# Altium footprint library SILICA_PCBLIB.PcbLib: 161 footprints (part 4 of 11)
Each footprint in its own frame and in the unit in brackets; x right, y up, seen from the top. Pads: shape width x height; smd on the part's side, far side on the other; paste and mask are expansions set on the pad; w line width, h text height; cw(c..) or ccw(c..) is an arc to the next point about the centre after c.
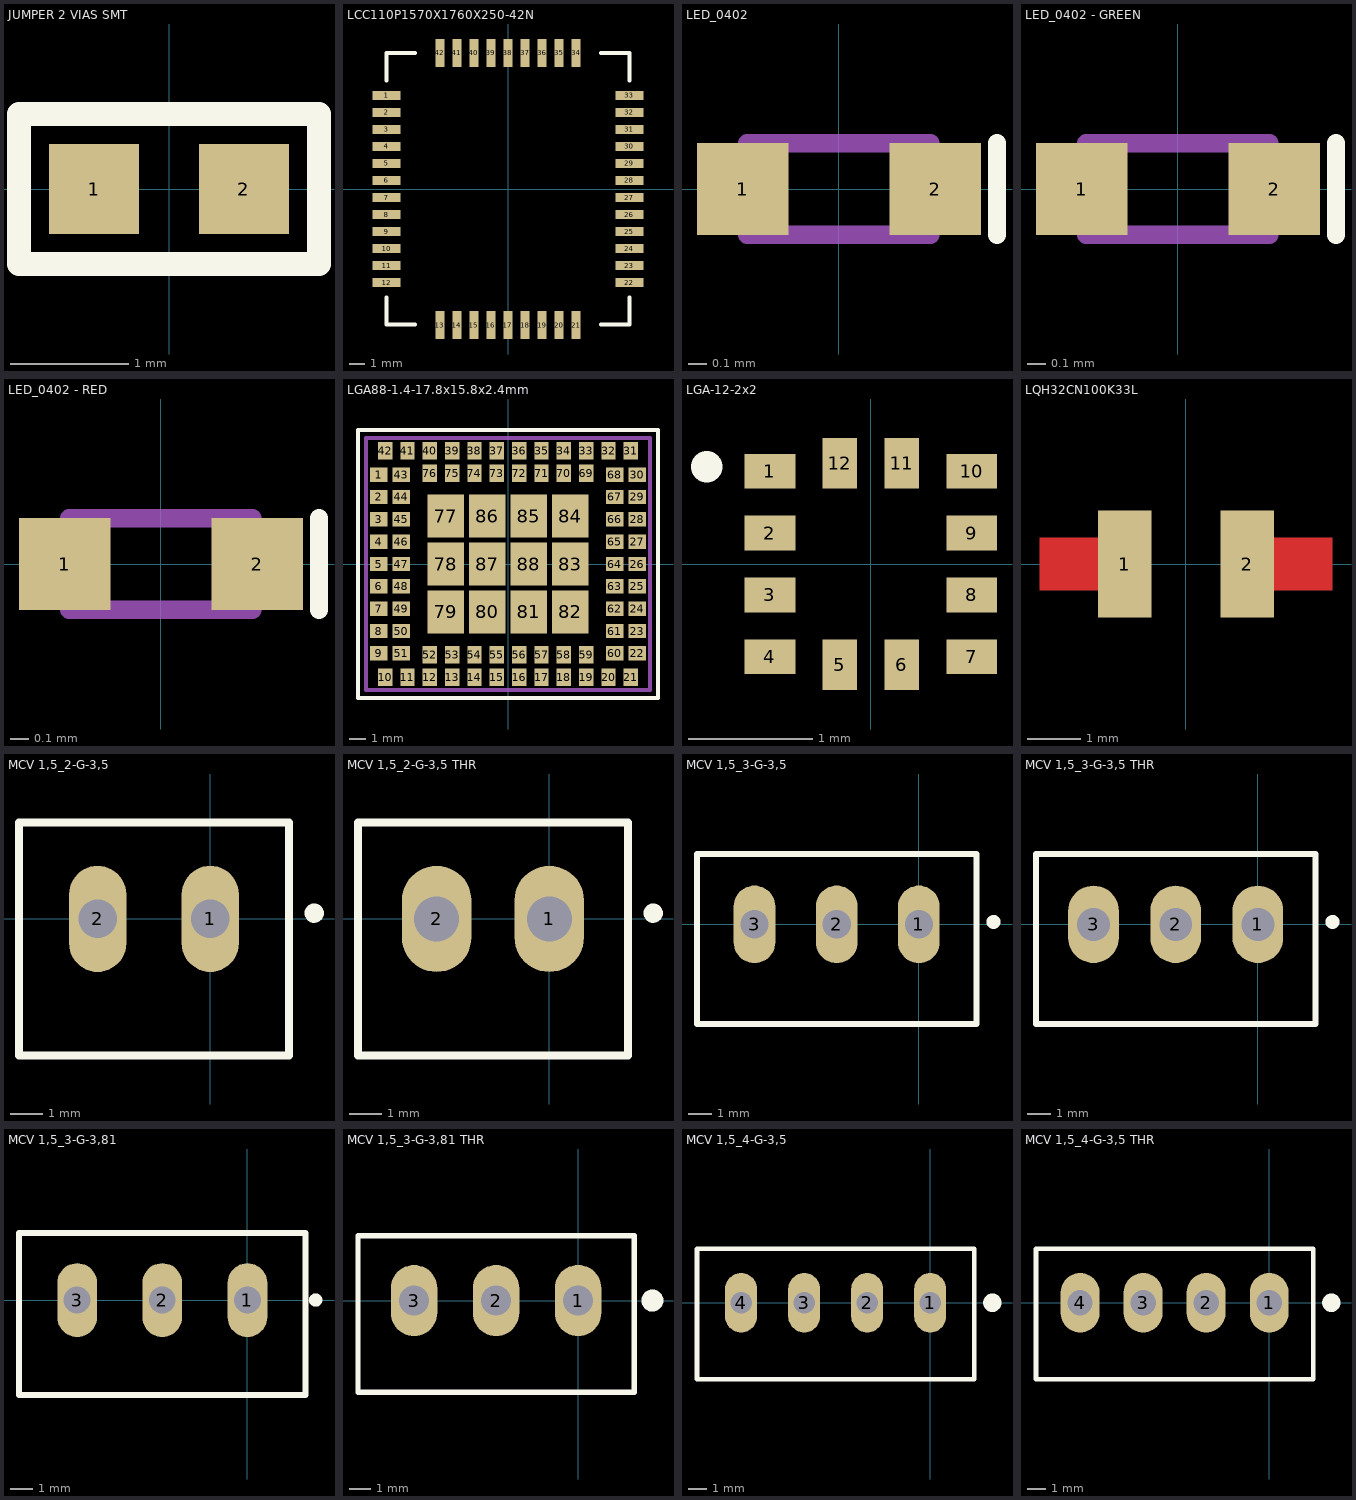
[diagram p3: the footprints below, top view; thin cyan lines are the x and y axes]

## JUMPER 2 VIAS SMT [mil]
height 51.18
pads (2):
  rect 30x30 smd: 1(-25,0) 2(25,0)
Top Overlay:
  lines w7.87: -50,-25 -50,25 50,25 50,-25 -50,-25

## LCC110P1570X1760X250-42N [mm] "SIM800C"
height 2.5
pads (42):
  rect 1.8x0.6 smd: 1(-7.85,6.05) 2(-7.85,4.95) 3(-7.85,3.85) 4(-7.85,2.75) 5(-7.85,1.65) 6(-7.85,0.55) 7(-7.85,-0.55) 8(-7.85,-1.65) 9(-7.85,-2.75) 10(-7.85,-3.85) 11(-7.85,-4.95) 12(-7.85,-6.05) 22(7.85,-6.05) 23(7.85,-4.95) 24(7.85,-3.85) 25(7.85,-2.75) 26(7.85,-1.65) 27(7.85,-0.55) 28(7.85,0.55) 29(7.85,1.65) 30(7.85,2.75) 31(7.85,3.85) 32(7.85,4.95) 33(7.85,6.05)
  rect 0.6x1.8 smd: 13(-4.4,-8.8) 14(-3.3,-8.8) 15(-2.2,-8.8) 16(-1.1,-8.8) 17(0,-8.8) 18(1.1,-8.8) 19(2.2,-8.8) 20(3.3,-8.8) 21(4.4,-8.8) 34(4.4,8.8) 35(3.3,8.8) 36(2.2,8.8) 37(1.1,8.8) 38(0,8.8) 39(-1.1,8.8) 40(-2.2,8.8) 41(-3.3,8.8) 42(-4.4,8.8)
Top Overlay:
  lines w0.254: -7.862,-7 -7.862,-8.762 -6,-8.762 ; -7.862,7 -7.862,8.8 -6,8.8 ; 6,-8.762 7.85,-8.762 7.85,-7 ; 6,8.8 7.85,8.8 7.85,7
Multi-Layer:
  pour cut-out: 5.75,7.438 5.75,2.475 6.8,2.475 6.8,7.438
3D body "User Library-SIM800C.STEP": height 2.3, standoff -0.01, extent -7.85,-8.8 7.85,8.8

## LED_0402 [mm]
height 0.5
pads (2):
  rect 0.5x0.5 smd paste-0.051 mask+0: 1(-0.525,0) 2(0.525,0)
Top Overlay:
  lines w0.1: 0.863,-0.25 0.863,0.25
Mechanical 13:
  lines w0.1: -0.5,-0.25 -0.5,0.25 0.5,0.25 0.5,-0.25 -0.5,-0.25
3D body "User Library-CAPC1005X06.STEP": height 0.6, standoff 0, extent -0.5,-0.25 0.5,0.25

## LED_0402 - GREEN [mm]
height 0.5
pads (2):
  rect 0.5x0.5 smd paste-0.051 mask+0: 1(-0.525,0) 2(0.525,0)
Top Overlay:
  lines w0.1: 0.863,-0.25 0.863,0.25
Mechanical 13:
  lines w0.1: -0.5,-0.25 0.5,-0.25 0.5,0.25 -0.5,0.25 -0.5,-0.25
3D body "User Library-led_0402LED0402 green.STEP": height 0.45, standoff 0, extent -0.505,-0.25 0.505,0.25

## LED_0402 - RED [mm]
height 0.5
pads (2):
  rect 0.5x0.5 smd paste-0.051 mask+0: 1(-0.525,0) 2(0.525,0)
Top Overlay:
  lines w0.1: 0.863,-0.25 0.863,0.25
Mechanical 13:
  lines w0.1: -0.5,-0.25 0.5,-0.25 0.5,0.25 -0.5,0.25 -0.5,-0.25
3D body "User Library-LED_1006_R.STEP": height 0.2, standoff 0, extent -0.5,-0.3 0.5,0.3

## LGA88-1.4-17.8x15.8x2.4mm [mm]
pads (88):
  rect 1.1x0.9 smd: 1(-8.1,5.6) 2(-8.1,4.2) 3(-8.1,2.8) 4(-8.1,1.4) 5(-8.1,0) 6(-8.1,-1.4) 7(-8.1,-2.8) 8(-8.1,-4.2) 9(-8.1,-5.6) 22(8.099,-5.6) 23(8.099,-4.2) 24(8.099,-2.8) 25(8.099,-1.4) 26(8.099,0) 27(8.099,1.4) 28(8.099,2.8) 29(8.099,4.2) 30(8.099,5.6) 43(-6.7,5.6) 44(-6.7,4.2) 45(-6.7,2.8) 46(-6.7,1.4) 47(-6.7,0) 48(-6.7,-1.4) 49(-6.7,-2.8) 50(-6.7,-4.2) 51(-6.7,-5.6) 60(6.699,-5.6) 61(6.699,-4.2) 62(6.699,-2.8) 63(6.699,-1.4) 64(6.699,0) 65(6.699,1.4) 66(6.699,2.8) 67(6.699,4.2) 68(6.699,5.6)
  rect 0.9x1.1 smd: 10(-7.7,-7.1) 11(-6.3,-7.1) 12(-4.9,-7.1) 13(-3.5,-7.1) 14(-2.1,-7.1) 15(-0.7,-7.1) 16(0.7,-7.1) 17(2.1,-7.1) 18(3.5,-7.1) 19(4.9,-7.1) 20(6.3,-7.1) 21(7.7,-7.1) 31(7.7,7.1) 32(6.3,7.1) 33(4.9,7.1) 34(3.5,7.1) 35(2.1,7.1) 36(0.7,7.1) 37(-0.7,7.1) 38(-2.1,7.1) 39(-3.5,7.1) 40(-4.9,7.1) 41(-6.3,7.1) 42(-7.7,7.1) 52(-4.9,-5.7) 53(-3.5,-5.7) 54(-2.1,-5.7) 55(-0.7,-5.7) 56(0.7,-5.7) 57(2.1,-5.7) 58(3.5,-5.7) 59(4.9,-5.7) 69(4.9,5.7) 70(3.5,5.7) 71(2.1,5.7) 72(0.7,5.7) 73(-0.7,5.7) 74(-2.1,5.7) 75(-3.5,5.7) 76(-4.9,5.7)
  rect 2.3x2.7 smd: 77(-3.9,3) 78(-3.9,0) 79(-3.9,-3) 80(-1.3,-3) 81(1.3,-3) 82(3.9,-3) 83(3.9,0) 84(3.9,3) 85(1.3,3) 86(-1.3,3) 87(-1.3,0) 88(1.3,0)
Top Overlay:
  lines w0.254: -9.4,-8.4 9.4,-8.4 9.4,8.4 -9.4,8.4 -9.4,-8.4
Mechanical 13:
  lines w0.254: -8.9,-7.9 -8.9,7.9 8.9,7.9 8.9,-7.9 -8.9,-7.9
3D body "User Library-SIM800H.STEP": height 2.42, standoff 0, extent -8.912,-7.912 8.888,7.888

## LGA-12-2x2 [mm]
pads (12):
  rect 0.41x0.28 smd: 1(-0.815,0.75) 2(-0.815,0.25) 3(-0.815,-0.25) 4(-0.815,-0.75) 7(0.815,-0.75) 8(0.815,-0.25) 9(0.815,0.25) 10(0.815,0.75)
  rect 0.28x0.41 smd: 5(-0.25,-0.815) 6(0.25,-0.815) 11(0.25,0.815) 12(-0.25,0.815)
Top Overlay:
  lines w0.254: -1.325,0.785 ccw(c-1.365,0.787) -1.325,0.787
3D body: height 1, standoff 0, extent -1,-1 1,1

## LQH32CN100K33L [mm] "MURATA INDUCTOR SERIES"
pads (2):
  rect 1x2 smd: 1(-1.15,0) 2(1.15,0)
Top Layer:
  region: -1.15,0.5 -2.75,0.5 -2.75,-0.5 -1.15,-0.5
  rectangle: 1.15,-0.5 2.75,0.5
Top Solder:
  region: -1.425,0.575 -2.812,0.575 -2.812,-0.575 -1.425,-0.575
  rectangle: 1.425,-0.575 2.812,0.575

## MCV 1,5_2-G-3,5 [mil]
height 362.2
pads (2):
  oval 70x130 hole 47.24: 1(0,0) 2(-137.8,0)
Top Overlay:
  circle w11.81: c127.09,7 r5.91
  lines w10: -234,-167.32 96.46,-167.32 96.46,118.11 -234,118.11 -234,-167.32
3D body "1843606.stp": height 362.2, standoff -133.86, extent -235,-166.72 95.71,118.72

## MCV 1,5_2-G-3,5 THR [mil]
height 362.2
pads (2):
  oval 85x130 hole 55.12: 1(0,0) 2(-137.8,0)
Top Overlay:
  circle w11.81: c127.09,7 r5.91
  lines w10: -234,-167.32 96.46,-167.32 96.46,118.11 -234,118.11 -234,-167.32
3D body "1843606.stp": height 362.2, standoff -133.86, extent -235,-166.72 95.71,118.72

## MCV 1,5_3-G-3,5 [mil]
height 362.2
pads (3):
  oval 70x130 hole 47.24: 1(0,0) 2(-137.8,0) 3(-275.59,0)
Top Overlay:
  circle w11.81: c125.09,4 r5.91
  lines w10: -372.05,-167.32 -372.05,118.11 96.46,118.11 96.46,-167.32 -372.05,-167.32
3D body "1843619.stp": height 362.2, standoff -133.86, extent -371.84,-167.43 96.66,118

## MCV 1,5_3-G-3,5 THR [mil]
height 362.2
pads (3):
  oval 85x130 hole 55.12: 1(0,0) 2(-137.8,0) 3(-275.59,0)
Top Overlay:
  circle w11.81: c125.09,4 r5.91
  lines w10: -372.05,-167.32 -372.05,118.11 96.46,118.11 96.46,-167.32 -372.05,-167.32
3D body "1843619.stp": height 362.2, standoff -133.86, extent -371.84,-167.43 96.66,118

## MCV 1,5_3-G-3,81 [mil]
height 362.2
pads (3):
  rrect100% 70x130 hole 47.24: 1(0,0) 2(-150,0.01) 3(-299.99,0.01)
Top Overlay:
  circle w11.81: c120.09,0 r5.91
  lines w10: -402.36,-167.32 102.36,-167.32 102.36,118.11 -402.36,118.11 -402.36,-167.32
3D body "1707010.stp": height 362.2, standoff -55.12, extent -402.36,-170 102.36,115.43

## MCV 1,5_3-G-3,81 THR [mil]
height 362.2
pads (3):
  rrect100% 85x130 hole 55.12: 1(0,0) 2(-150,0.01) 3(-299.99,0.01)
Top Overlay:
  circle w19.68: c135.83,0 r10.2
  lines w10: -402.36,-167.32 -402.36,118.11 102.36,118.11 102.36,-167.32 -402.36,-167.32
3D body "1707010.stp": height 362.2, standoff -55.12, extent -402.36,-170 102.36,115.43

## MCV 1,5_4-G-3,5 [mil]
height 362.2
pads (4):
  oval 70x130 hole 47.24: 1(0,0) 2(-137.8,0) 3(-275.59,0) 4(-413.39,0)
Top Overlay:
  circle w19.68: c135.83,0 r10.2
  lines w10: -509.84,-167.32 -509.84,118.11 96.46,118.11 96.46,-167.32 -509.84,-167.32
3D body "1843622.stp": height 363.2, standoff -132.86, extent -509.84,-167.72 96.45,117.72

## MCV 1,5_4-G-3,5 THR [mil]
height 362.2
pads (4):
  oval 85x130 hole 55.12: 1(0,0) 2(-137.8,0) 3(-275.59,0) 4(-413.39,0)
Top Overlay:
  circle w19.68: c135.83,0 r10.2
  lines w10: -509.84,-167.32 96.46,-167.32 96.46,118.11 -509.84,118.11 -509.84,-167.32
3D body "1843622.stp": height 363.2, standoff -132.86, extent -509.84,-167.72 96.45,117.72